# Altium footprint library JL_PCB.PCBLIB: 1112 footprints (part 42 of 71)
Each footprint in its own frame and in the unit in brackets; x right, y up, seen from the top. Pads: shape width x height; smd on the part's side, far side on the other; paste and mask are expansions set on the pad; w line width, h text height; cw(c..) or ccw(c..) is an arc to the next point about the centre after c.
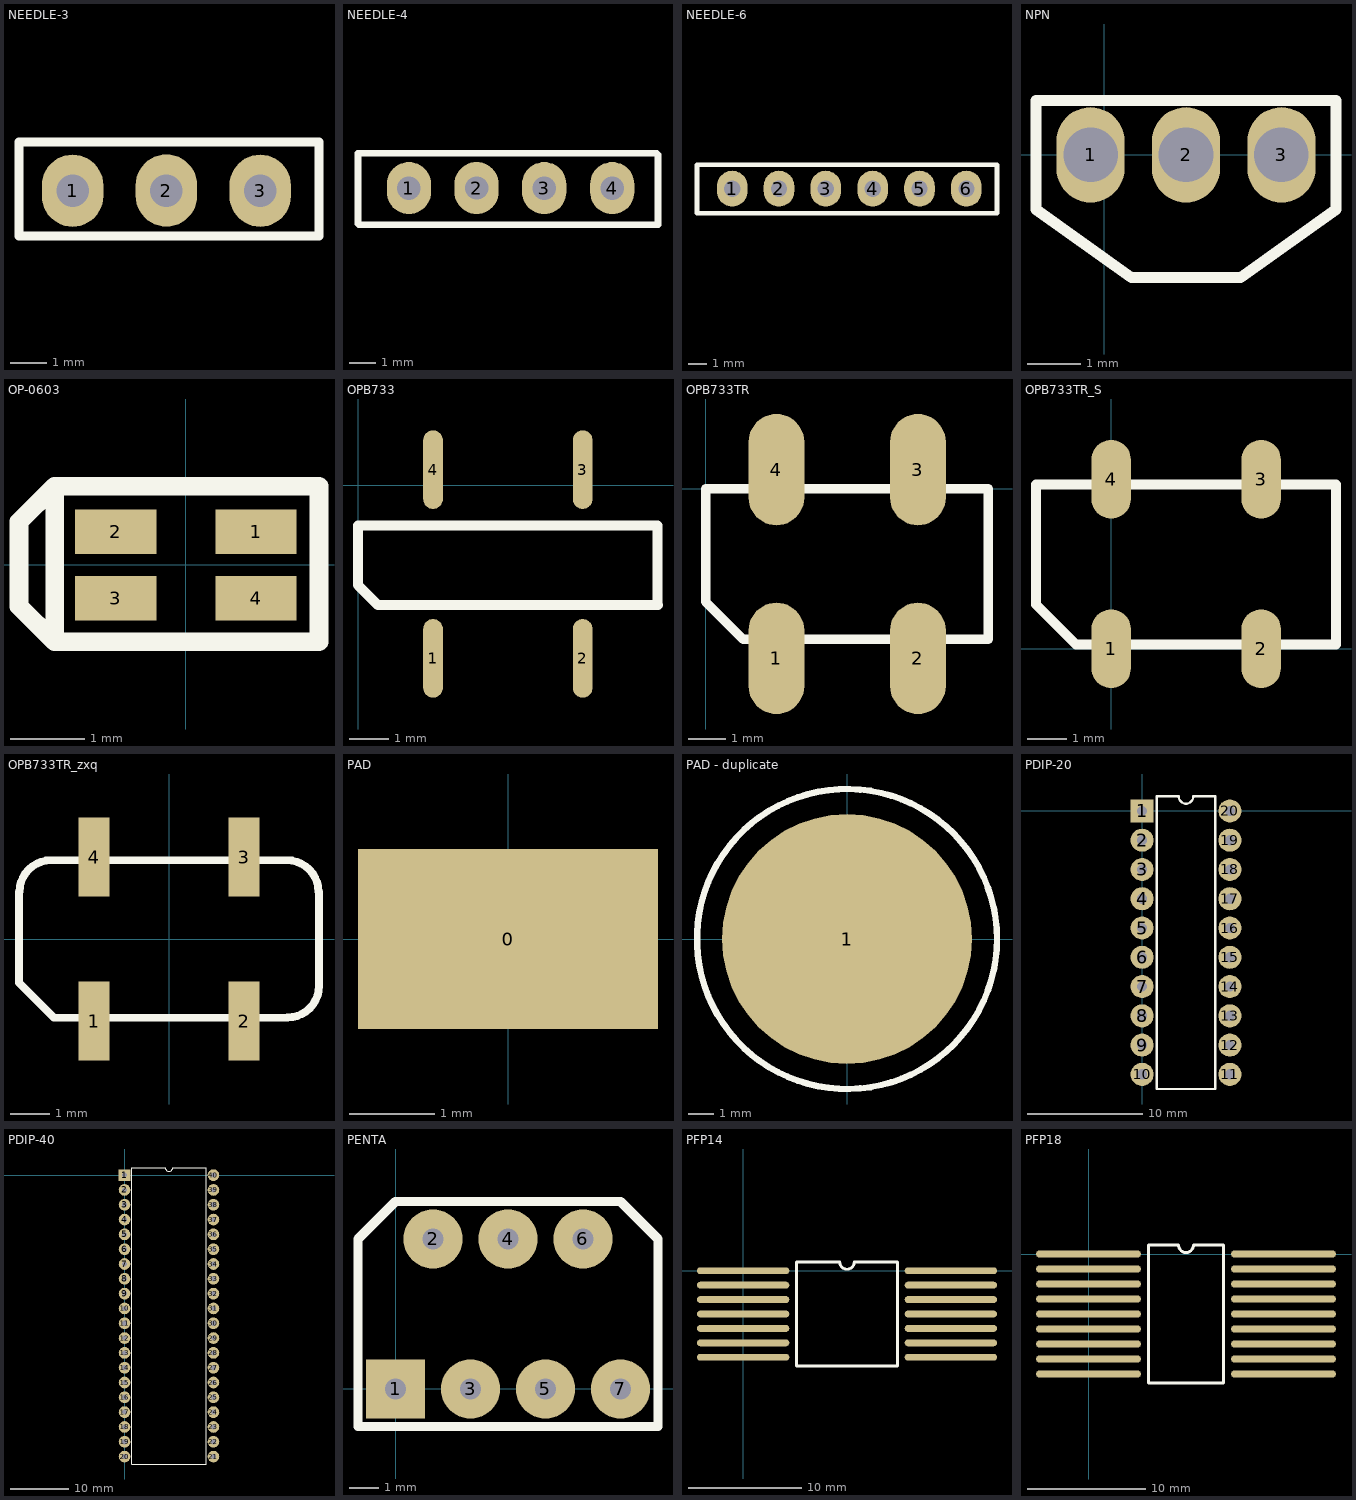
[diagram p41: the footprints below, top view; thin cyan lines are the x and y axes]

## NEEDLE-3 [mm]
pads (3):
  oval 1.7x2 hole 0.9: 1(297.583,114.754) 2(300.178,114.758) 3(302.773,114.754)
TopOverlay:
  lines w0.254: 296.1,113.5 304.4,113.5 304.4,116.1 296.1,116.1 296.1,113.5

## NEEDLE-4 [mm]
pads (4):
  oval 1.7x2 hole 0.9: 1(297.555,114.865) 2(300.15,114.869) 3(302.745,114.865) 4(305.355,114.865)
TopOverlay:
  lines w0.254: 295.6,113.5 295.6,116.2 307.056,116.2 307.111,116.144 307.111,113.462 ; 295.638,113.462 307.111,113.462 ; 307.073,113.5 307.111,113.462

## NEEDLE-6 [mm]
pads (6):
  oval 1.7x2 hole 0.9: 1(298.368,115.652) 2(300.963,115.656) 3(303.558,115.652) 4(306.168,115.652) 5(308.768,115.652) 6(311.368,115.652)
TopOverlay:
  lines w0.254: 296.413,114.287 313.068,114.287 313.068,116.987 296.413,116.987 296.413,114.287

## NPN [mil]
pads (3):
  oval 50x70 hole 40: 1(-10,0) 2(60,0) 3(130,0)
TopOverlay:
  lines w8: -50,-40 -50,40 170,40 170,-40 100,-90 20,-90 -50,-40

## OP-0603 [mm]
pads (4):
  rect 1.1x0.6 smd: 1(0.95,0.45) 2(-0.95,0.45) 3(-0.95,-0.45) 4(0.95,-0.45)
TopOverlay:
  lines w0.254: -1.778,1.041 -1.778,1.067 ; -1.778,-1.041 1.803,-1.041 1.803,1.067 -1.778,1.067 ; -1.778,-1.041 -1.778,1.067 ; -1.778,-1.041 -2.261,-0.559 -2.261,0.584 -1.778,1.067
3D body "OP-0603.STEP": height 0.65, standoff 0, extent -0.864,-0.787 0.736,0.813

## OPB733 [mm]
pads (4):
  oval 0.5x2 smd: 1(1.91,-4.4) 2(5.72,-4.4) 3(5.72,0.4) 4(1.91,0.4)
TopOverlay:
  lines w0.254: 7.62,-3.032 7.62,-1.016 0,-1.016 0,-2.54 0.508,-3.048 1.016,-3.048 7.636,-3.048

## OPB733TR [mm]
pads (4):
  oval 1.5x3 smd: 1(1.91,-4.572) 2(5.72,-4.572) 3(5.72,0.508) 4(1.91,0.508)
TopOverlay:
  lines w0.254: 0,-3.048 0,0 ; 0,-3.048 1.016,-4.064 7.62,-4.064 ; 0,-3.048 0,0 ; 0,0 7.62,0 ; 0,0 7.62,0 ; 7.62,-4.064 7.62,0 ; 7.62,-4.064 7.62,0

## OPB733TR_S [mm]
pads (4):
  oval 1x2 smd: 1(0,0) 2(3.81,0) 3(3.81,4.3) 4(0,4.3)
TopOverlay:
  lines w0.254: -1.91,1.124 -1.91,4.172 ; -1.91,1.124 -0.894,0.108 5.71,0.108 ; -1.91,1.124 -1.91,4.172 ; -1.91,4.172 5.71,4.172 ; -1.91,4.172 5.71,4.172 ; 5.71,0.108 5.71,4.172 ; 5.71,0.108 5.71,4.172

## OPB733TR_zxq [mm]
pads (4):
  rect 0.8x2 smd: 1(-1.905,-2.083) 2(1.905,-2.083) 3(1.905,2.083) 4(-1.905,2.083)
TopOverlay:
  lines w0.2: -3.81,1.2 -3.81,-1.111 -2.921,-2 2.997,-2 ; -3.797,1.2 cw(c-2.997,1.2) -2.997,2 2.997,2 cw(c2.997,1.2) 3.797,1.2 ; 3.01,-1.994 ccw(c3.01,-1.194) 3.81,-1.194 ; 3.81,-1.2 3.81,1.2

## PAD [mm]
pads (1):
  rect 3.5x2.1 smd: 0(0,0)

## PAD - duplicate [mm]
pads (1):
  round 10 smd: 1(0,0)
TopOverlay:
  circle w0.254: c0,0 r6

## PDIP-20 [mm]
pads (20):
  rect 2x2 hole 0.889: 1(0,0)
  round 2 hole 0.889: 2(0,-2.54) 3(0,-5.08) 4(0,-7.62) 5(0,-10.16) 6(0,-12.7) 7(0,-15.24) 8(0,-17.78) 9(0,-20.32) 10(0,-22.86) 11(7.62,-22.86) 12(7.62,-20.32) 13(7.62,-17.78) 14(7.62,-15.24) 15(7.62,-12.7) 16(7.62,-10.16) 17(7.62,-7.62) 18(7.62,-5.08) 19(7.62,-2.54) 20(7.62,0)
TopOverlay:
  lines w0.2: 1.27,-24.13 1.27,1.27 3.175,1.27 ccw(c3.81,1.27) 4.445,1.27 6.35,1.27 6.35,-24.13 1.27,-24.13

## PDIP-40 [mm]
pads (40):
  rect 2x2 hole 0.889: 1(0,0)
  round 2 hole 0.889: 2(0,-2.54) 3(0,-5.08) 4(0,-7.62) 5(0,-10.16) 6(0,-12.7) 7(0,-15.24) 8(0,-17.78) 9(0,-20.32) 10(0,-22.86) 11(0,-25.4) 12(0,-27.94) 13(0,-30.48) 14(0,-33.02) 15(0,-35.56) 16(0,-38.1) 17(0,-40.64) 18(0,-43.18) 19(0,-45.72) 20(0,-48.26) 21(15.24,-48.26) 22(15.24,-45.72) 23(15.24,-43.18) 24(15.24,-40.64) 25(15.24,-38.1) 26(15.24,-35.56) 27(15.24,-33.02) 28(15.24,-30.48) 29(15.24,-27.94) 30(15.24,-25.4) 31(15.24,-22.86) 32(15.24,-20.32) 33(15.24,-17.78) 34(15.24,-15.24) 35(15.24,-12.7) 36(15.24,-10.16) 37(15.24,-7.62) 38(15.24,-5.08) 39(15.24,-2.54) 40(15.24,0)
TopOverlay:
  lines w0.2: 1.27,-49.53 13.97,-49.53 13.97,1.27 8.255,1.27 cw(c7.62,1.27) 6.985,1.27 1.27,1.27 1.27,-49.53

## PENTA [mm]
pads (7):
  rect 2x2 hole 0.711: 1(0,0)
  round 2 hole 0.711: 2(1.27,5.08) 3(2.54,0) 4(3.81,5.08) 5(5.08,0) 6(6.35,5.08) 7(7.62,0)
TopOverlay:
  lines w0.305: -1.27,-1.27 8.89,-1.27 8.89,5.08 7.62,6.35 0,6.35 -1.27,5.08 -1.27,-1.27

## PFP14 [mil]
pads (14):
  oval 320x24 smd: 1(0,0) 2(0,-50) 3(0,-100) 4(0,-150) 5(0,-200) 6(0,-250) 7(0,-300) 8(720,-300) 9(720,-250) 10(720,-200) 11(720,-150) 12(720,-100) 13(720,-50) 14(720,0)
TopOverlay:
  lines w10: 185,-330 535,-330 535,30 385,30 cw(c360,30) 335,30 185,30 185,-330

## PFP18 [mil]
pads (18):
  oval 350x24 smd: 1(0,0) 2(0,-50) 3(0,-100) 4(0,-150) 5(0,-200) 6(0,-250) 7(0,-300) 8(0,-350) 9(0,-400) 10(650,-400) 11(650,-350) 12(650,-300) 13(650,-250) 14(650,-200) 15(650,-150) 16(650,-100) 17(650,-50) 18(650,0)
TopOverlay:
  lines w10: 200,-430 200,30 300,30 ccw(c325,30) 350,30 450,30 450,-430 200,-430